# Altium footprint library 3.05-RJ11-RJ45-D_SUB-VGA-SCSI接口-网络变压器.PcbLib: 53 footprints (part 2 of 4)
Each footprint in its own frame and in the unit in brackets; x right, y up, seen from the top. Pads: shape width x height; smd on the part's side, far side on the other; paste and mask are expansions set on the pad; w line width, h text height; cw(c..) or ccw(c..) is an arc to the next point about the centre after c.
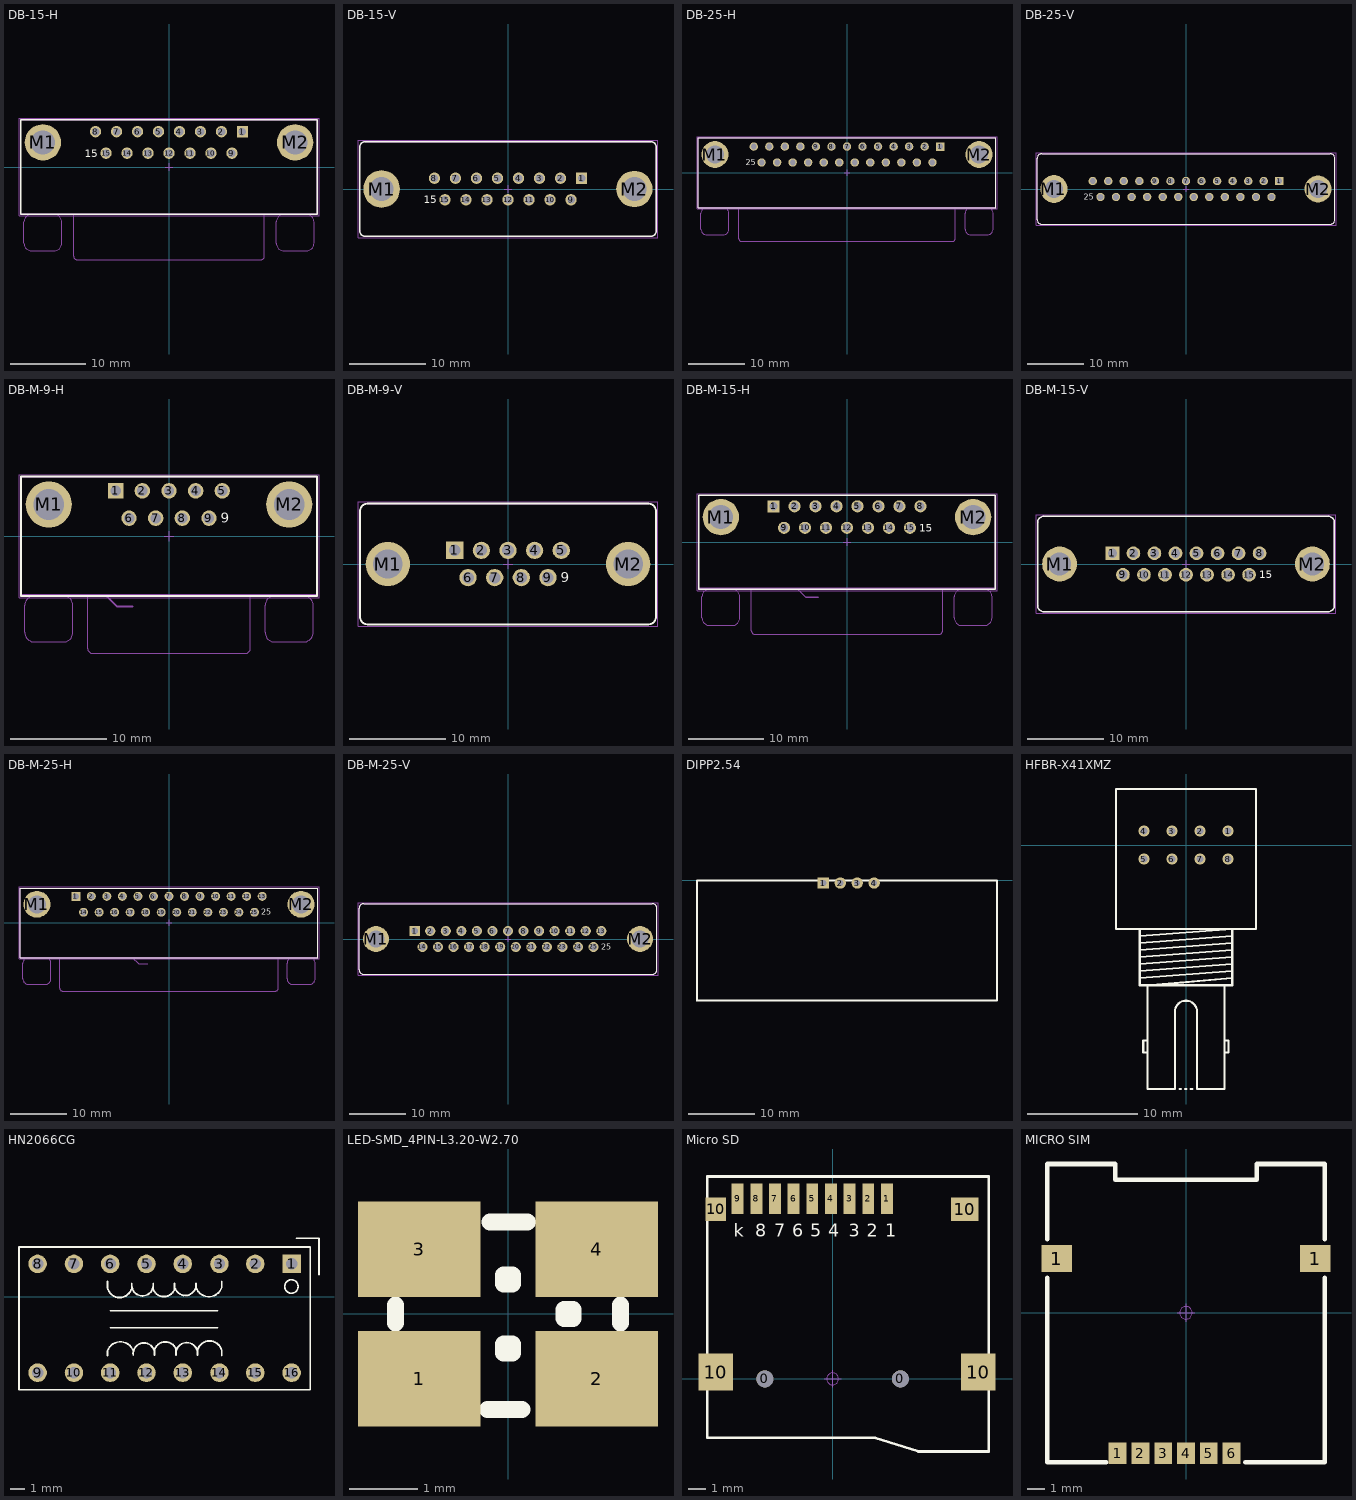
[diagram p1: the footprints below, top view; thin cyan lines are the x and y axes]

## DB-15-H [mm] "15 pins, right angled, 8.08mm, with hex screw"
height 12.5
pads (17):
  rect 1.5x1.5 hole 1: 1(9.695,4.67)
  round 1.5 hole 1: 2(6.925,4.67) 3(4.155,4.67) 4(1.385,4.67) 5(-1.385,4.67) 6(-4.155,4.67) 7(-6.925,4.67) 8(-9.695,4.67) 9(8.31,1.83) 10(5.54,1.83) 11(2.77,1.83) 12(0,1.83) 13(-2.77,1.83) 14(-5.54,1.83) 15(-8.31,1.83)
  round 4.8 hole 3.2: M1(-16.65,3.25) M2(16.65,3.25)
Top Overlay:
  lines w0.2: -19.6,-6.25 19.6,-6.25 19.6,6.25 -19.6,6.25 -19.6,-6.25
  text "15" at -11.15,1.3 h1.02
Mechanical 2:
  lines w0.1: -19.6,-6.17 19.6,-6.17
  text "PCB Edge" at -3.5,-7.57 h1.02
Mechanical 13:
  lines w0.1: -18.15,-6.25 ccw(c-18.15,-7.25) -19.15,-7.25 -19.15,-10.05 ccw(c-18.15,-10.05) -18.15,-11.05 -15.15,-11.05 ccw(c-15.15,-10.05) -14.15,-10.05 -14.15,-7.25 ccw(c-15.15,-7.25) -15.15,-6.25 ; -12.6,-6.25 -12.6,-11.75 ccw(c-12.1,-11.75) -12.1,-12.25 12.1,-12.25 ccw(c12.1,-11.75) 12.6,-11.75 12.6,-6.25 ; 15.15,-6.25 ccw(c15.15,-7.25) 14.15,-7.25 14.15,-10.05 ccw(c15.15,-10.05) 15.15,-11.05 18.15,-11.05 ccw(c18.15,-10.05) 19.15,-10.05 19.15,-7.25 ccw(c18.15,-7.25) 18.15,-6.25 ; -19.6,-6.25 19.6,-6.25 19.6,6.25 -19.6,6.25 -19.6,-6.25 ; 3.8,-12.25 3.8,-12.25
Mechanical 15:
  lines w0.05: -0.5,0 0.5,0 ; 0,-0.5 0,0.5 ; -19.8,-6.45 -19.8,6.45 19.8,6.45 19.8,-6.45 -19.8,-6.45
3D body: height 12.55, standoff -3.8, extent -19.6,-12.25 19.6,6.25

## DB-15-V [mm] "15 pins, straight"
height 10.7
pads (17):
  rect 1.5x1.5 hole 1: 1(9.695,1.42)
  round 1.5 hole 1: 2(6.925,1.42) 3(4.155,1.42) 4(1.385,1.42) 5(-1.385,1.42) 6(-4.155,1.42) 7(-6.925,1.42) 8(-9.695,1.42) 9(8.31,-1.42) 10(5.54,-1.42) 11(2.77,-1.42) 12(0,-1.42) 13(-2.77,-1.42) 14(-5.54,-1.42) 15(-8.31,-1.42)
  oval 4.8x4.95 hole 3.2: M1(-16.66,0)
  round 4.8 hole 3.2: M2(16.66,0)
Top Overlay:
  lines w0.2: -18.77,-6.25 cw(c-18.77,-5.45) -19.57,-5.45 -19.57,5.45 cw(c-18.77,5.45) -18.77,6.25 ; -18.76,-6.25 18.76,-6.25 ; -18.76,6.25 18.76,6.25 ; 18.77,-6.25 ccw(c18.77,-5.45) 19.57,-5.45 19.57,5.45 ccw(c18.77,5.45) 18.77,6.25
  text "15" at -11.1,-1.9 h1.02
Mechanical 13:
  lines w0.1: -18.77,-6.25 cw(c-18.77,-5.45) -19.57,-5.45 -19.57,5.45 cw(c-18.77,5.45) -18.77,6.25 ; -18.76,-6.25 18.76,-6.25 ; -18.76,6.25 18.76,6.25 ; 18.77,-6.25 ccw(c18.77,-5.45) 19.57,-5.45 19.57,5.45 ccw(c18.77,5.45) 18.77,6.25
Mechanical 15:
  lines w0.05: -0.5,0 0.5,0 ; 0,-0.5 0,0.5 ; -19.77,-6.45 -19.77,6.45 19.77,6.45 19.77,-6.45 -19.77,-6.45
3D body: height 12.78, standoff -3.72, extent -19.57,-6.25 19.57,6.25

## DB-25-H [mm] "25 pins, right angled, 8.08mm, with hex screw"
height 12.5
pads (27):
  rect 1.5x1.5 hole 1: 1(16.62,4.67)
  round 1.5 hole 1: 2(13.85,4.67) 3(11.08,4.67) 4(8.31,4.67) 5(5.54,4.67) 6(2.77,4.67) 7(0,4.67) 8(-2.77,4.67) 9(-5.54,4.67) 10(-8.31,4.67) 11(-11.08,4.67) 12(-13.85,4.67) 13(-16.62,4.67) 14(15.235,1.83) 15(12.465,1.83) 16(9.695,1.83) 17(6.925,1.83) 18(4.155,1.83) 19(1.385,1.83) 20(-1.385,1.83) 21(-4.155,1.83) 22(-6.925,1.83) 23(-9.695,1.83) 24(-12.465,1.83) 25(-15.235,1.83)
  round 4.8 hole 3.2: M1(-23.55,3.25) M2(23.55,3.25)
Top Overlay:
  lines w0.2: -26.55,-6.25 -26.55,6.25 26.55,6.25 26.55,-6.25 -26.55,-6.25
  text "25" at -18.075,1.3 h1.02
Mechanical 2:
  lines w0.1: -26.55,-6.17 26.55,-6.17
  text "PCB Edge" at -3.5,-7.57 h1.02
Mechanical 13:
  lines w0.1: -25.05,-6.25 ccw(c-25.05,-7.25) -26.05,-7.25 -26.05,-10.05 ccw(c-25.05,-10.05) -25.05,-11.05 -22.05,-11.05 ccw(c-22.05,-10.05) -21.05,-10.05 -21.05,-7.25 ccw(c-22.05,-7.25) -22.05,-6.25 ; -19.3,-6.25 -19.3,-11.75 ccw(c-18.8,-11.75) -18.8,-12.25 18.8,-12.25 ccw(c18.8,-11.75) 19.3,-11.75 19.3,-6.25 ; 22.05,-6.25 ccw(c22.05,-7.25) 21.05,-7.25 21.05,-10.05 ccw(c22.05,-10.05) 22.05,-11.05 25.05,-11.05 ccw(c25.05,-10.05) 26.05,-10.05 26.05,-7.25 ccw(c25.05,-7.25) 25.05,-6.25 ; -26.55,-6.25 -26.55,6.25 26.55,6.25 26.55,-6.25 -26.55,-6.25 ; 10.5,-12.25 10.5,-12.25
Mechanical 15:
  lines w0.05: -0.5,0 0.5,0 ; 0,-0.5 0,0.5 ; -26.75,-6.45 26.75,-6.45 26.75,6.45 -26.75,6.45 -26.75,-6.45
3D body: height 12.55, standoff -3.8, extent -26.55,-12.25 26.55,6.25

## DB-25-V [mm] "25 pins, straight"
height 10.7
pads (27):
  rect 1.5x1.5 hole 1: 1(16.62,1.42)
  round 1.5 hole 1: 2(13.85,1.42) 3(11.08,1.42) 4(8.31,1.42) 5(5.54,1.42) 6(2.77,1.42) 7(0,1.42) 8(-2.77,1.42) 9(-5.54,1.42) 10(-8.31,1.42) 11(-11.08,1.42) 12(-13.85,1.42) 13(-16.62,1.42) 14(15.235,-1.42) 15(12.465,-1.42) 16(9.695,-1.42) 17(6.925,-1.42) 18(4.155,-1.42) 19(1.385,-1.42) 20(-1.385,-1.42) 21(-4.155,-1.42) 22(-6.925,-1.42) 23(-9.695,-1.42) 24(-12.465,-1.42) 25(-15.235,-1.42)
  oval 4.8x4.95 hole 3.2: M1(-23.52,0)
  round 4.8 hole 3.2: M2(23.52,0)
Top Overlay:
  lines w0.2: -25.72,-6.25 cw(c-25.72,-5.45) -26.52,-5.45 -26.52,5.45 cw(c-25.72,5.45) -25.72,6.25 ; -25.685,-6.25 25.685,-6.25 ; -25.685,6.25 25.685,6.25 ; 25.72,-6.25 ccw(c25.72,-5.45) 26.52,-5.45 26.52,5.45 ccw(c25.72,5.45) 25.72,6.25
  text "25" at -18.2,-1.9 h1.02
Mechanical 13:
  lines w0.1: -25.72,-6.25 cw(c-25.72,-5.45) -26.52,-5.45 -26.52,5.45 cw(c-25.72,5.45) -25.72,6.25 ; -25.685,-6.25 25.685,-6.25 ; -25.685,6.25 25.685,6.25 ; 25.72,-6.25 ccw(c25.72,-5.45) 26.52,-5.45 26.52,5.45 ccw(c25.72,5.45) 25.72,6.25
Mechanical 15:
  lines w0.05: -0.5,0 0.5,0 ; 0,-0.5 0,0.5 ; -26.72,-6.45 -26.72,6.45 26.72,6.45 26.72,-6.45 -26.72,-6.45
3D body: height 12.78, standoff -3.72, extent -26.52,-6.25 26.52,6.25

## DB-M-9-H [mm] "9 pins, right angled, 8.08mm, with hex screw"
height 12.5
pads (11):
  rect 1.6x1.6 hole 1.09: 1(-5.54,4.72)
  round 1.6 hole 1.09: 2(-2.77,4.72) 3(0,4.72) 4(2.77,4.72) 5(5.54,4.72) 6(-4.155,1.88) 7(-1.385,1.88) 8(1.385,1.88) 9(4.155,1.88)
  round 4.8 hole 3.2: M1(-12.5,3.3) M2(12.5,3.3)
Top Overlay:
  lines w0.2: -15.4,-6.2 -15.4,6.2 15.4,6.2 15.4,-6.2 -15.4,-6.2
  text "9" at 5.4,1.4 h1.02
Mechanical 2:
  lines w0.2: -15.4,-6.12 15.4,-6.12 ; -6.6,-6.12 -5.42,-7.3 -3.8,-7.3
  text "PCB Edge" at -3.4,-7.82 h1.02
Mechanical 13:
  lines w0.1: -14,-6.2 ccw(c-14,-7.2) -15,-7.2 -15,-10 ccw(c-14,-10) -14,-11 -11,-11 ccw(c-11,-10) -10,-10 -10,-7.2 ccw(c-11,-7.2) -11,-6.2 ; -8.46,-6.2 -8.46,-11.68 ccw(c-7.96,-11.68) -7.96,-12.18 7.94,-12.18 ; 7.96,-12.18 ccw(c7.96,-11.68) 8.46,-11.68 8.46,-6.2 ; 11,-6.2 ccw(c11,-7.2) 10,-7.2 10,-10 ccw(c11,-10) 11,-11 14,-11 ccw(c14,-10) 15,-10 15,-7.2 ccw(c14,-7.2) 14,-6.2 ; -15.4,-6.2 15.4,-6.2 15.4,6.2 -15.4,6.2 -15.4,-6.2 ; 7.95,-12.18 7.95,-12.18
Mechanical 15:
  lines w0.05: -0.5,0 0.5,0 ; 0,-0.5 0,0.5 ; -15.6,-6.4 15.6,-6.4 15.6,6.4 -15.6,6.4 -15.6,-6.4
3D body: height 12.65, standoff -3.16, extent -15.45,-12.527 15.45,5.973

## DB-M-9-V [mm] "Male 09p Straight With board clip & Hex screw"
height 10.9
pads (11):
  rect 1.8x1.8 hole 1.2: 1(-5.54,1.42)
  round 1.8 hole 1.2: 2(-2.77,1.42) 3(0,1.42) 4(2.77,1.42) 5(5.54,1.42) 6(-4.155,-1.42) 7(-1.385,-1.42) 8(1.385,-1.42) 9(4.155,-1.42)
  round 4.6 hole 3.05: M1(-12.5,0) M2(12.5,0)
Top Overlay:
  lines w0.2: -15.405,-5.475 ccw(c-14.605,-5.475) -14.605,-6.275 14.605,-6.275 ccw(c14.605,-5.475) 15.405,-5.475 15.405,5.475 ccw(c14.605,5.475) 14.605,6.275 -14.605,6.275 ccw(c-14.605,5.475) -15.405,5.475 -15.405,-5.475
  text "9" at 5.5,-1.9 h1.02
Mechanical 13:
  lines w0.1: -15.405,-5.475 ccw(c-14.605,-5.475) -14.605,-6.275 14.605,-6.275 ccw(c14.605,-5.475) 15.405,-5.475 15.405,5.475 ccw(c14.605,5.475) 14.605,6.275 -14.605,6.275 ccw(c-14.605,5.475) -15.405,5.475 -15.405,-5.475
Mechanical 15:
  lines w0.05: -0.5,0 0.5,0 ; 0,-0.5 0,0.5 ; -15.605,-6.475 15.605,-6.475 15.605,6.475 -15.605,6.475 -15.605,-6.475
3D body: height 13.22, standoff -3.88, extent -15.4,-6.275 15.4,6.275

## DB-M-15-H [mm] "15 pins, right angled, 8.08mm, with hex screw"
height 12.5
pads (17):
  rect 1.6x1.6 hole 1.09: 1(-9.695,4.72)
  round 1.6 hole 1.09: 2(-6.925,4.72) 3(-4.155,4.72) 4(-1.385,4.72) 5(1.385,4.72) 6(4.155,4.72) 7(6.925,4.72) 8(9.695,4.72) 9(-8.31,1.88) 10(-5.54,1.88) 11(-2.77,1.88) 12(0,1.88) 13(2.77,1.88) 14(5.54,1.88) 15(8.31,1.88)
  round 4.8 hole 3.2: M1(-16.65,3.3) M2(16.65,3.3)
Top Overlay:
  lines w0.2: -19.6,-6.2 -19.6,6.2 19.6,6.2 19.6,-6.2 -19.6,-6.2
  text "15" at 9.555,1.4 h1.02
Mechanical 2:
  lines w0.2: -19.6,-6.12 19.6,-6.12 ; -6.6,-6.12 -5.42,-7.3 -3.8,-7.3
  text "PCB Edge" at -3.4,-7.82 h1.02
Mechanical 13:
  lines w0.1: -18.15,-6.2 ccw(c-18.15,-7.2) -19.15,-7.2 -19.15,-10 ccw(c-18.15,-10) -18.15,-11 -15.15,-11 ccw(c-15.15,-10) -14.15,-10 -14.15,-7.2 ccw(c-15.15,-7.2) -15.15,-6.2 ; -12.625,-6.2 -12.625,-11.68 ccw(c-12.125,-11.68) -12.125,-12.18 12.125,-12.18 ccw(c12.125,-11.68) 12.625,-11.68 12.625,-6.2 ; 15.15,-6.2 ccw(c15.15,-7.2) 14.15,-7.2 14.15,-10 ccw(c15.15,-10) 15.15,-11 18.15,-11 ccw(c18.15,-10) 19.15,-10 19.15,-7.2 ccw(c18.15,-7.2) 18.15,-6.2 ; -19.6,-6.2 19.6,-6.2 19.6,6.2 -19.6,6.2 -19.6,-6.2
Mechanical 15:
  lines w0.05: -0.5,0 0.5,0 ; 0,-0.5 0,0.5 ; -19.8,-6.4 19.8,-6.4 19.8,6.4 -19.8,6.4 -19.8,-6.4
3D body: height 12.55, standoff -3.95, extent -19.6,-12.2 19.6,6.2

## DB-M-15-V [mm] "Male 15p Straight With board clip & Hex screw"
height 10.9
pads (17):
  rect 1.8x1.8 hole 1.2: 1(-9.695,1.42)
  round 1.8 hole 1.2: 2(-6.925,1.42) 3(-4.155,1.42) 4(-1.385,1.42) 5(1.385,1.42) 6(4.155,1.42) 7(6.925,1.42) 8(9.695,1.42) 9(-8.31,-1.42) 10(-5.54,-1.42) 11(-2.77,-1.42) 12(0,-1.42) 13(2.77,-1.42) 14(5.54,-1.42) 15(8.31,-1.42)
  round 4.6 hole 3.05: M1(-16.66,0) M2(16.66,0)
Top Overlay:
  lines w0.2: -19.57,-5.475 ccw(c-18.77,-5.475) -18.77,-6.275 18.77,-6.275 ccw(c18.77,-5.475) 19.57,-5.475 19.57,5.475 ccw(c18.77,5.475) 18.77,6.275 -18.77,6.275 ccw(c-18.77,5.475) -19.57,5.475 -19.57,-5.475
  text "15" at 9.655,-1.9 h1.02
Mechanical 13:
  lines w0.1: -19.57,-5.475 ccw(c-18.77,-5.475) -18.77,-6.275 18.77,-6.275 ccw(c18.77,-5.475) 19.57,-5.475 19.57,5.475 ccw(c18.77,5.475) 18.77,6.275 -18.77,6.275 ccw(c-18.77,5.475) -19.57,5.475 -19.57,-5.475
Mechanical 15:
  lines w0.05: -0.5,0 0.5,0 ; 0,-0.5 0,0.5 ; -19.77,-6.475 -19.77,6.475 19.77,6.475 19.77,-6.475 -19.77,-6.475
3D body: height 13.22, standoff -3.88, extent -19.6,-6.275 19.6,6.275

## DB-M-25-H [mm] "25 pins, right angled, 8.08mm, with hex screw"
height 12.5
pads (27):
  rect 1.6x1.6 hole 1.09: 1(-16.62,4.72)
  round 1.6 hole 1.09: 2(-13.85,4.72) 3(-11.08,4.72) 4(-8.31,4.72) 5(-5.54,4.72) 6(-2.77,4.72) 7(0,4.72) 8(2.77,4.72) 9(5.54,4.72) 10(8.31,4.72) 11(11.08,4.72) 12(13.85,4.72) 13(16.62,4.72) 14(-15.235,1.88) 15(-12.465,1.88) 16(-9.695,1.88) 17(-6.925,1.88) 18(-4.155,1.88) 19(-1.385,1.88) 20(1.385,1.88) 21(4.155,1.88) 22(6.925,1.88) 23(9.695,1.88) 24(12.465,1.88) 25(15.235,1.88)
  round 4.8 hole 3.2: M1(-23.55,3.3) M2(23.55,3.3)
Top Overlay:
  lines w0.2: -26.55,-6.2 -26.55,6.2 26.55,6.2 26.55,-6.2 -26.55,-6.2
  text "25" at 16.48,1.4 h1.02
Mechanical 2:
  lines w0.2: -26.55,-6.12 26.55,-6.12 ; -6.6,-6.12 -5.42,-7.3 -3.8,-7.3
  text "PCB Edge" at -3.4,-7.82 h1.02
Mechanical 13:
  lines w0.1: -25.05,-6.2 ccw(c-25.05,-7.2) -26.05,-7.2 -26.05,-10 ccw(c-25.05,-10) -25.05,-11 -22.05,-11 ccw(c-22.05,-10) -21.05,-10 -21.05,-7.2 ccw(c-22.05,-7.2) -22.05,-6.2 ; -19.48,-6.2 -19.48,-11.68 ccw(c-18.98,-11.68) -18.98,-12.18 18.98,-12.18 ccw(c18.98,-11.68) 19.48,-11.68 19.48,-6.2 ; 22.05,-6.2 ccw(c22.05,-7.2) 21.05,-7.2 21.05,-10 ccw(c22.05,-10) 22.05,-11 25.05,-11 ccw(c25.05,-10) 26.05,-10 26.05,-7.2 ccw(c25.05,-7.2) 25.05,-6.2 ; -26.55,-6.2 26.55,-6.2 26.55,6.2 -26.55,6.2 -26.55,-6.2
Mechanical 15:
  lines w0.05: -0.5,0 0.5,0 ; 0,-0.5 0,0.5 ; -26.75,-6.4 26.75,-6.4 26.75,6.4 -26.75,6.4 -26.75,-6.4
3D body: height 12.55, standoff -3.95, extent -26.55,-12.2 26.55,6.2

## DB-M-25-V [mm] "Male 25p Straight With board clip & Hex screw"
height 10.9
pads (27):
  rect 1.8x1.8 hole 1.2: 1(-16.62,1.42)
  round 1.8 hole 1.2: 2(-13.85,1.42) 3(-11.08,1.42) 4(-8.31,1.42) 5(-5.54,1.42) 6(-2.77,1.42) 7(0,1.42) 8(2.77,1.42) 9(5.54,1.42) 10(8.31,1.42) 11(11.08,1.42) 12(13.85,1.42) 13(16.62,1.42) 14(-15.235,-1.42) 15(-12.465,-1.42) 16(-9.695,-1.42) 17(-6.925,-1.42) 18(-4.155,-1.42) 19(-1.385,-1.42) 20(1.385,-1.42) 21(4.155,-1.42) 22(6.925,-1.42) 23(9.695,-1.42) 24(12.465,-1.42) 25(15.235,-1.42)
  round 4.6 hole 3.05: M1(-23.52,0) M2(23.52,0)
Top Overlay:
  lines w0.2: -26.52,-5.475 ccw(c-25.72,-5.475) -25.72,-6.275 25.72,-6.275 ccw(c25.72,-5.475) 26.52,-5.475 26.52,5.475 ccw(c25.72,5.475) 25.72,6.275 -25.72,6.275 ccw(c-25.72,5.475) -26.52,5.475 -26.52,-5.475
  text "25" at 16.58,-1.9 h1.02
Mechanical 13:
  lines w0.1: -26.52,-5.475 ccw(c-25.72,-5.475) -25.72,-6.275 25.72,-6.275 ccw(c25.72,-5.475) 26.52,-5.475 26.52,5.475 ccw(c25.72,5.475) 25.72,6.275 -25.72,6.275 ccw(c-25.72,5.475) -26.52,5.475 -26.52,-5.475
Mechanical 15:
  lines w0.05: -0.5,0 0.5,0 ; 0,-0.5 0,0.5 ; -26.72,-6.475 26.72,-6.475 26.72,6.475 -26.72,6.475 -26.72,-6.475
3D body: height 13.22, standoff -3.88, extent -26.525,-6.275 26.525,6.275

## DIPP2.54 [mm]
pads (4):
  rect 1.7x1.7 hole 0.9: 1(32.131,-0.381)
  round 1.7 hole 0.9: 2(34.671,-0.381) 3(37.211,-0.381) 4(39.751,-0.381)
Top Overlay:
  lines w0.3: 13.187,-18 13.208,-18.021 58.166,-18.021 58.166,-0.021 58.145,0 13.187,0 13.187,-18
3D body: height 20.5, standoff -4.68, extent 13.187,-18.068 58.187,0

## HFBR-X41XMZ [mm]
height 10.2
pads (8):
  round 1 hole 0.6: 1(3.81,1.27) 2(1.27,1.27) 3(-1.27,1.27) 4(-3.81,1.27) 5(-3.81,-1.27) 6(-1.27,-1.27) 7(1.27,-1.27) 8(3.81,-1.27)
Top Overlay:
  lines w0.2: -4.2,-12.065 4.2,-11.43 ; -4.2,-11.43 4.2,-10.795 ; -4.2,-10.795 4.2,-10.16 ; -4.2,-10.16 4.2,-9.525 ; -4.2,-9.525 4.2,-8.89 ; -4.2,-8.89 4.191,-8.255 ; -4.191,-8.255 4.2,-7.62 ; -3.5,-18.82 -3.881,-18.82 -3.881,-17.72 -3.5,-17.72 ; -3.175,-12.72 4.2,-12.065 ; -0.579,-22.12 -0.452,-22.12 ; -0.071,-22.12 0.056,-22.12 ; 0.437,-22.12 0.564,-22.12 ; 1,-15.12 1,-22.12 3.5,-22.12 3.5,-12.72 -3.5,-12.72 -3.5,-22.12 -1,-22.12 -1,-15.12 cw(c0,-15.113) 1,-15.113 ; 3.5,-18.82 3.866,-18.82 3.866,-17.72 3.5,-17.72 ; 4.2,-7.62 4.2,-12.72 -4.2,-12.72 -4.2,-7.62 4.2,-7.62 ; -6.35,-7.62 6.35,-7.62 6.35,5.08 -6.35,5.08 -6.35,-7.62

## HN2066CG [mm] "ANSFORMER"
pads (16):
  rect 1.3x1.3 / inner round 1.3 / far side round 1.3 hole 0.8: 1(-15.738,2.286)
  round 1.3 hole 0.8: 2(-18.288,2.286) 3(-20.795,2.286) 4(-23.368,2.286) 5(-25.908,2.286) 6(-28.448,2.286) 7(-30.988,2.286) 8(-33.538,2.286) 9(-33.538,-5.334) 10(-30.988,-5.334) 11(-28.448,-5.334) 12(-25.908,-5.334) 13(-23.368,-5.334) 14(-20.795,-5.334) 15(-18.288,-5.334) 16(-15.738,-5.334)
Top Overlay:
  circle w0.127: c-15.753,0.704 r0.473
  lines w0.127: -28.638,-4.127 -28.638,-3.813 cw(c-27.738,-4.114) -26.838,-3.813 -26.838,-4.088 cw(c-26.088,-4.005) -25.338,-4.087 -25.338,-3.688 cw(c-24.588,-3.978) -23.838,-3.687 ; -28.638,1.079 -28.638,0.612 ccw(c-27.788,0.802) -26.938,0.612 -26.938,0.913 ccw(c-26.188,0.803) -25.438,0.913 -25.438,0.513 ; -28.438,-2.187 -20.938,-2.187 ; -28.438,-0.988 -20.938,-0.988 ; -25.438,0.512 ccw(c-24.688,0.803) -23.938,0.513 -23.938,0.913 ccw(c-23.188,0.83) -22.438,0.912 -22.438,0.638 ; -23.838,-3.688 -23.838,-4.088 cw(c-23.088,-3.978) -22.338,-4.088 -22.338,-3.787 cw(c-21.488,-3.977) -20.638,-3.787 -20.638,-4.127 ; -22.438,0.637 ccw(c-21.538,0.938) -20.638,0.638 ; -20.638,0.638 -20.638,1.079 ; -15.393,4.082 -13.823,4.082 -13.823,1.552 ; -34.838,-6.524 -34.838,3.476 -14.438,3.476 -14.438,-6.524 -34.838,-6.524

## LED-SMD_4PIN-L3.20-W2.70 [mm] "封装库来自淘宝卖家 ID：黄晶宝石"
pads (4):
  rect 1.8x1.4 smd: 1(-1.3,-0.95) 2(1.3,-0.95) 3(-1.3,0.95) 4(1.3,0.95)
Top Overlay:
  lines w0.254: -1.651,-0.127 -1.651,0.127 ; -0.3,-1.4 0.2,-1.4 ; -0.265,1.35 0.281,1.35 ; 1.651,-0.127 1.651,0.127 ; -0.064,-0.572 0.063,-0.572 0.063,-0.445 -0.064,-0.445 -0.064,-0.572 ; -0.064,0.444 0.063,0.444 0.063,0.571 -0.064,0.571 -0.064,0.444 ; 0.825,-0.064 0.952,-0.064 0.952,0.063 0.825,0.063 0.825,-0.064
3D body: height 0.8, standoff 0, extent -1.524,-1.397 1.524,1.397

## Micro SD [mm] "淘宝ID:黄晶宝石"
pads (15):
  round 1 hole 1 unplated: 0(-4,0) 0(4,0)
  rect 0.7x1.8 smd: 1(3.2,10.627) 2(2.1,10.627) 3(1,10.627) 4(-0.1,10.627) 5(-1.2,10.627) 6(-2.3,10.627) 7(-3.4,10.627) 8(-4.5,10.627) 9(-5.6,10.627)
  rect 2.032x2.2 smd: 10(-6.9,0.4) 10(8.6,0.4)
  rect 1.2x1.4 smd: 10(-6.9,10)
  rect 1.6x1.4 smd: 10(7.8,10)
Top Overlay:
  lines w0.152: 2.489,-3.47 5.054,-4.283 9.204,-4.283 9.204,11.938 -7.402,11.938 -7.402,-3.47 2.514,-3.47
  text "k" at -5.842,8.382 h0.76
  text "8" at -4.572,8.382 h0.76
  text "7" at -3.455,8.382 h0.76
  text "6" at -2.388,8.382 h0.76
  text "5" at -1.321,8.382 h0.76
  text "4" at -0.254,8.382 h0.76
  text "3" at 0.939,8.382 h0.76
  text "2" at 2.006,8.382 h0.76
  text "1" at 3.098,8.382 h0.76
Mechanical 15:
  circle w0.05: c0,0 r0.35
  lines w0.05: -0.5,0 0.5,0 ; 0,-0.5 0,0.5
3D body: height 2, standoff -0.45, extent -7.05,-3.873 8.95,11.377

## MICRO SIM [mm] "16.30mm*14.66mm*1.8mm(长*宽*厚）淘宝ID:黄晶宝石   店铺网址:https://shop463601444.taobao.com"
pads (8):
  rect 1.7x1.5 smd: 1(-7.2,3.02) 1(7.2,3.02)
  rect 1x1.2 smd: 1(-3.81,-7.83) 2(-2.54,-7.83) 3(-1.27,-7.83) 4(0,-7.83) 5(1.27,-7.83) 6(2.54,-7.83)
Top Overlay:
  lines w0.254: -7.747,1.949 -7.747,-8.338 -4.445,-8.338 ; -7.747,4.108 -7.747,8.299 -3.937,8.299 -3.937,7.41 3.937,7.41 3.937,8.299 7.747,8.299 7.747,4.108 ; 3.302,-8.338 7.747,-8.338 7.747,1.949
Mechanical 15:
  circle w0.05: c0,0 r0.35
  lines w0.05: -0.5,0 0.5,0 ; 0,-0.5 0,0.5
3D body: height 1.85, standoff 0.04, extent -7.58,-8.13 7.58,8.13